# Altium schematic symbol library IC_ADI.SCHLIB: 3169 symbols (part 94 of 181)
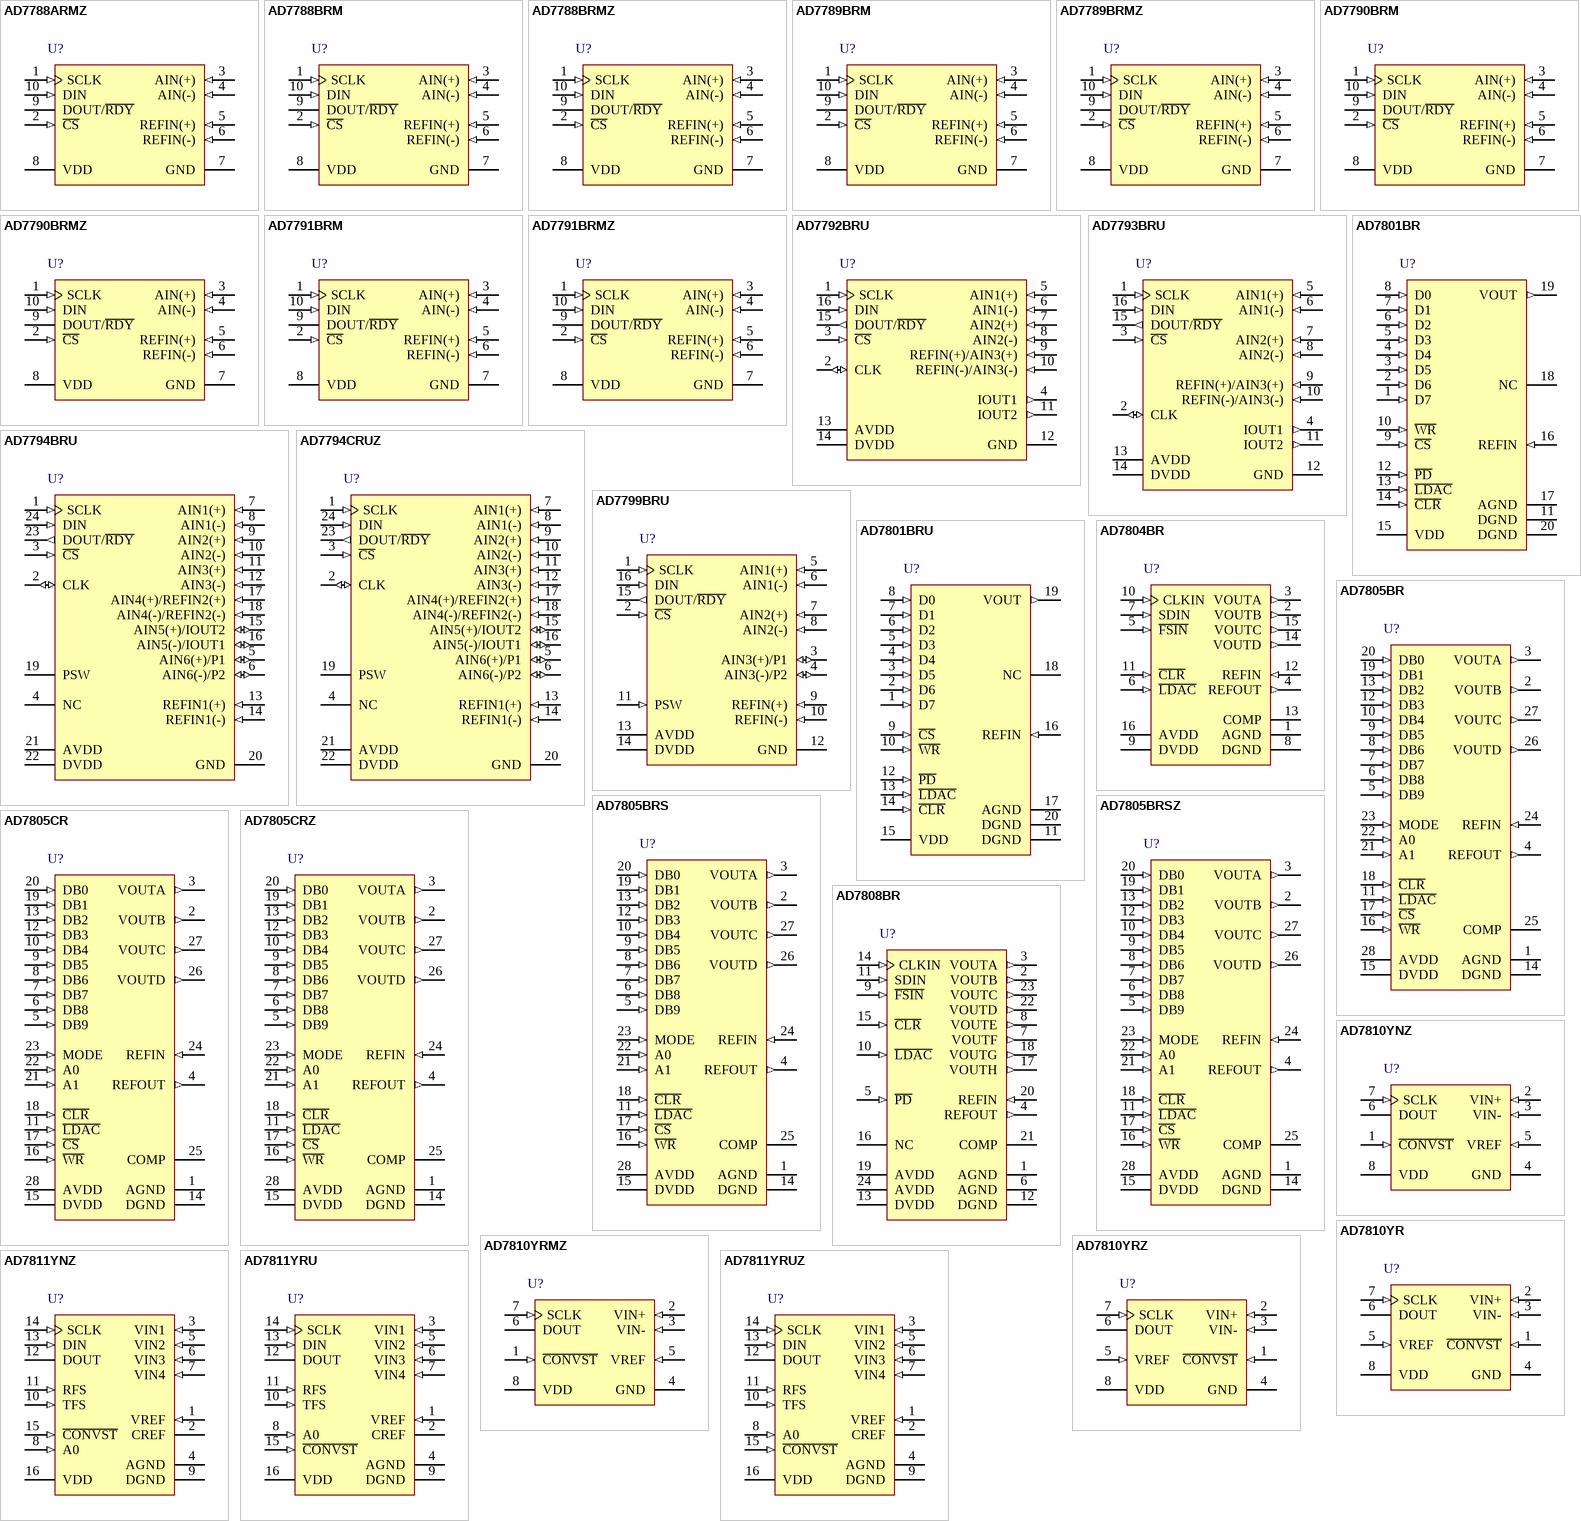
[diagram p284: symbols AD7788ARMZ to AD7811YRUZ]

## AD7789BRMZ
designator U?
Single 24-Bit Low Power Sigma-Delta Analog-to-Digital Converter with Serial, SPI Interface, 16.6SPS, -40 to +105 degC, RM-10, Pb-Free, Tube; Generic Part Number: AD7789; PartNumber: AD7789BRMZ; Resolution (Bits): 24; Channels: 1; Throughput Rate (SPS): 16.6; Interface: Ser, SPI; DatasheetVersion: Rev.B; PackageVersion: May-2005; PackageReference: RM-10; PackageDescription: 10-Lead Mini Small Outline Package [MSOP]; Supplier Part Number 1: AD7789BRMZ-ND; Supplier Part Number 2: 1143278; Supplier Part Number 3: 59K5451; Supplier Part Number 4: 584-AD7789BRMZ; RoHS: Y; Packing: Tube; Mounting Technology: Surface Mount; ComponentLink1Description: Manufacturer URL; ComponentLink2Description: Datasheet; ComponentLink3Description: Package Specification; ComponentLink4Description: Product URL
footprint VSSOP10_0.5 (Footprint not found)
pins: 1 SCLK (in) "Serial Clock Input for Data Transfers to and from the ADC. The SCLK has a Schmitt-triggered input, making the interface suitable for opto-isolated applications. The serial clock can be continuous, with all data transmitted (See Datasheet)", 2 ~{CS} (in) "Chip Select Input. This is an active low logic input used to select the ADC. C\S\ can be used to select the ADC in systems with more than one device on the serial bus or as a frame synchronization signal in communicating (See Datasheet)", 3 AIN(+) (in) "Analog Input. AIN(+) is the positive terminal of the fully differential analog input.", 4 AIN(-) (in) "Analog Input. AIN(-) is the negative terminal of the fully differential analog input.", 5 REFIN(+) (in) "Positive Reference Input. REFIN(+) can lie anywhere between VDD and GND + 0.1 V. The nominal reference voltage (REFIN(+) - REFIN(-)) is 2.5 V, but the part functions with a reference from 0.1 V to VDD.", 6 REFIN(-) (in) "Negative Reference Input. This reference input can lie anywhere between GND and VDD - 0.1 V.", 7 GND (power) "Ground Reference Point.", 8 VDD (power) "Supply Voltage. 3 V or 5 V nominal.", 9 DOUT/~{RDY} (hiz) "The DOUT/R\D\Y\ falling edge can be used as an interrupt to a processor, indicating that valid data is available. With an external serial clock, the data can be read using the DOUT/R\D\Y\ pin. With C\S\ low, the data/control (See Datasheet)", 10 DIN (in) "Serial Data Input to the Input Shift Register on the ADC. Data in this shift register is transferred to the control registers within the ADC; the register selection bits of the communications register identify the (See Datasheet)"

## AD7790BRM
designator U?
Single 16-Bit Low Power Sigma-Delta Analog-to-Digital Converter with Serial, SPI Interface, 120SPS, -40 to +105 degC, RM-10, Tube; Generic Part Number: AD7790; PartNumber: AD7790BRM; Resolution (Bits): 16; Channels: 1; Throughput Rate (SPS): 120; Interface: Ser, SPI; DatasheetVersion: Rev.0; PackageVersion: May-2005; PackageReference: RM-10; PackageDescription: 10-Lead Mini Small Outline Package [MSOP]; Supplier Part Number 1: AD7790BRM-ND; Supplier Part Number 2: 584-AD7790BRM; RoHS: N; Packing: Tube; Mounting Technology: Surface Mount; ComponentLink1Description: Manufacturer URL; ComponentLink2Description: Datasheet; ComponentLink3Description: Package Specification; ComponentLink4Description: Product URL
footprint VSSOP10_0.5 (Footprint not found)
pins: 1 SCLK (in) "Serial Clock Input for Data Transfers to and from the ADC. The SCLK has a Schmitttriggered input, making the interface suitable for opto-isolated applications. The serial clock can be continuous with all data transmitted in (See Datasheet)", 2 ~{CS} (in) "Chip Select Input. This is an active low logic input used to select the ADC. CS can be used to select the ADC in systems with more than one device on the serial bus or as a frame synchronization signal in communicating with (See Datasheet)", 3 AIN(+) (in) "Analog Input. AIN(+) is the positive terminal of the fully differential analog input.", 4 AIN(-) (in) "Analog Input. AIN(-) is the negative terminal of the fully differential analog input.", 5 REFIN(+) (in) "Positive Reference Input. REFIN(+) can lie anywhere between VDD and GND + 0.1 V. The nominal reference voltage (REFIN(+) --REFIN(-)) is 2.5 V, but the part functions with a reference from 0.1 V to VDD.", 6 REFIN(-) (in) "Negative Reference Input. This reference input can lie anywhere between GND and VDD - 0.1 V.", 7 GND (power) "Ground Reference Point.", 8 VDD (power) "Supply Voltage, 2.5 V to 5.25 V.", 9 DOUT/~{RDY} (hiz) "Serial Data Output/Data Ready Output. DOUT/R\D\Y\ serves a dual purpose . It functions as a serial data output pin to access the output shift register of the ADC. The output shift register can contain data from any of the (See Datasheet)", 10 DIN (in) "Serial Data Input to the Input Shift Register on the ADC. Data in this shift register is transferred to the control registers within the ADC, the register selection bits of the communications register identifying the (See Datasheet)"

## AD7790BRMZ
designator U?
Single 16-Bit Low Power Sigma-Delta Analog-to-Digital Converter with Serial, SPI Interface, 120SPS, -40 to +105 degC, RM-10, Pb-Free, Tube; Generic Part Number: AD7790; PartNumber: AD7790BRMZ; Resolution (Bits): 16; Channels: 1; Throughput Rate (SPS): 120; Interface: Ser, SPI; DatasheetVersion: Rev.0; PackageVersion: May-2005; PackageReference: RM-10; PackageDescription: 10-Lead Mini Small Outline Package [MSOP]; Supplier Part Number 1: AD7790BRMZ-ND; Supplier Part Number 2: 1438545; Supplier Part Number 3: 59K5456; Supplier Part Number 4: 584-AD7790BRMZ; RoHS: Y; Packing: Tube; Mounting Technology: Surface Mount; ComponentLink1Description: Manufacturer URL; ComponentLink2Description: Datasheet; ComponentLink3Description: Package Specification; ComponentLink4Description: Product URL
footprint VSSOP10_0.5 (Footprint not found)
pins: 1 SCLK (in) "Serial Clock Input for Data Transfers to and from the ADC. The SCLK has a Schmitttriggered input, making the interface suitable for opto-isolated applications. The serial clock can be continuous with all data transmitted in (See Datasheet)", 2 ~{CS} (in) "Chip Select Input. This is an active low logic input used to select the ADC. CS can be used to select the ADC in systems with more than one device on the serial bus or as a frame synchronization signal in communicating with (See Datasheet)", 3 AIN(+) (in) "Analog Input. AIN(+) is the positive terminal of the fully differential analog input.", 4 AIN(-) (in) "Analog Input. AIN(-) is the negative terminal of the fully differential analog input.", 5 REFIN(+) (in) "Positive Reference Input. REFIN(+) can lie anywhere between VDD and GND + 0.1 V. The nominal reference voltage (REFIN(+) --REFIN(-)) is 2.5 V, but the part functions with a reference from 0.1 V to VDD.", 6 REFIN(-) (in) "Negative Reference Input. This reference input can lie anywhere between GND and VDD - 0.1 V.", 7 GND (power) "Ground Reference Point.", 8 VDD (power) "Supply Voltage, 2.5 V to 5.25 V.", 9 DOUT/~{RDY} (hiz) "Serial Data Output/Data Ready Output. DOUT/R\D\Y\ serves a dual purpose . It functions as a serial data output pin to access the output shift register of the ADC. The output shift register can contain data from any of the (See Datasheet)", 10 DIN (in) "Serial Data Input to the Input Shift Register on the ADC. Data in this shift register is transferred to the control registers within the ADC, the register selection bits of the communications register identifying the (See Datasheet)"

## AD7791BRM
designator U?
Single 24-Bit Low Power Sigma-Delta Analog-to-Digital Converter with Serial, SPI Interface, 120SPS, -40 to +105 degC, RM-10, Tube; Generic Part Number: AD7791; PartNumber: AD7791BRM; Resolution (Bits): 24; Channels: 1; Throughput Rate (SPS): 120; Interface: Ser, SPI; DatasheetVersion: Rev.0; PackageVersion: May-2005; PackageReference: RM-10; PackageDescription: 10-Lead Mini Small Outline Package [MSOP]; Supplier Part Number 1: AD7791BRM-ND; Supplier Part Number 2: 584-AD7791BRM; RoHS: N; Packing: Tube; Mounting Technology: Surface Mount; ComponentLink1Description: Manufacturer URL; ComponentLink2Description: Datasheet; ComponentLink3Description: Package Specification; ComponentLink4Description: Product URL
footprint VSSOP10_0.5 (Footprint not found)
pins: 1 SCLK (in) "Serial Clock Input for Data Transfers to and from the ADC. The SCLK has a Schmitttriggered input, making the interface suitable for opto-isolated applications. The serial clock can be continuous with all data transmitted in (See Datasheet)", 2 ~{CS} (in) "Chip Select Input. This is an active low logic input used to select the ADC. C\S\ can be used to select the ADC in systems with more than one device on the serial bus or as a frame synchronization signal in communicating (See Datasheet)", 3 AIN(+) (in) "Analog Input. AIN(+) is the positive terminal of the fully differential analog input.", 4 AIN(-) (in) "Analog Input. AIN(-) is the negative terminal of the fully differential analog input.", 5 REFIN(+) (in) "Positive Reference Input. REFIN(+) can lie anywhere between VDD and GND + 0.1 V. The nominal reference voltage (REFIN(+) -REFIN(-)) is 2.5 V, but the part functions with a reference from 0.1 V to VDD.", 6 REFIN(-) (in) "Negative Reference Input. This reference input can lie anywhere between GND and VDD - 0.1 V.", 7 GND (power) "Ground Reference Point.", 8 VDD (power) "Supply Voltage, 2.5 V to 5.25 V.", 9 DOUT/~{RDY} (hiz) "Serial Data Output/Data Ready Output. DOUT/R\D\Y\ serves a dual purpose . It functions as a serial data output pin to access the output shift register of the ADC. The output shift register can contain data from any of the (See Datasheet)", 10 DIN (in) "Serial Data Input to the Input Shift Register on the ADC. Data in this shift register is transferred to the control registers within the ADC, the register selection bits of the communications register identifying the (See Datasheet)"

## AD7791BRMZ
designator U?
Single 24-Bit Low Power Sigma-Delta Analog-to-Digital Converter with Serial, SPI Interface, 120SPS, -40 to +105 degC, RM-10, Pb-Free, Tube; Generic Part Number: AD7791; PartNumber: AD7791BRMZ; Resolution (Bits): 24; Channels: 1; Throughput Rate (SPS): 120; Interface: Ser, SPI; DatasheetVersion: Rev.0; PackageVersion: May-2005; PackageReference: RM-10; PackageDescription: 10-Lead Mini Small Outline Package [MSOP]; Supplier Part Number 1: AD7791BRMZ-ND; Supplier Part Number 2: 1581942; Supplier Part Number 3: 19M0896; Supplier Part Number 4: 584-AD7791BRMZ; RoHS: Y; Packing: Tube; Mounting Technology: Surface Mount; ComponentLink1Description: Manufacturer URL; ComponentLink2Description: Datasheet; ComponentLink3Description: Package Specification; ComponentLink4Description: Product URL
footprint VSSOP10_0.5 (Footprint not found)
pins: 1 SCLK (in) "Serial Clock Input for Data Transfers to and from the ADC. The SCLK has a Schmitttriggered input, making the interface suitable for opto-isolated applications. The serial clock can be continuous with all data transmitted in (See Datasheet)", 2 ~{CS} (in) "Chip Select Input. This is an active low logic input used to select the ADC. C\S\ can be used to select the ADC in systems with more than one device on the serial bus or as a frame synchronization signal in communicating (See Datasheet)", 3 AIN(+) (in) "Analog Input. AIN(+) is the positive terminal of the fully differential analog input.", 4 AIN(-) (in) "Analog Input. AIN(-) is the negative terminal of the fully differential analog input.", 5 REFIN(+) (in) "Positive Reference Input. REFIN(+) can lie anywhere between VDD and GND + 0.1 V. The nominal reference voltage (REFIN(+) -REFIN(-)) is 2.5 V, but the part functions with a reference from 0.1 V to VDD.", 6 REFIN(-) (in) "Negative Reference Input. This reference input can lie anywhere between GND and VDD - 0.1 V.", 7 GND (power) "Ground Reference Point.", 8 VDD (power) "Supply Voltage, 2.5 V to 5.25 V.", 9 DOUT/~{RDY} (hiz) "Serial Data Output/Data Ready Output. DOUT/R\D\Y\ serves a dual purpose . It functions as a serial data output pin to access the output shift register of the ADC. The output shift register can contain data from any of the (See Datasheet)", 10 DIN (in) "Serial Data Input to the Input Shift Register on the ADC. Data in this shift register is transferred to the control registers within the ADC, the register selection bits of the communications register identifying the (See Datasheet)"

## AD7792BRU
designator U?
3 Channel 16-Bit Low Noise Low Power Sigma-Delta Analog-to-Digital Converter with Serial, SPI Interface and On-Chip In-Amp and Reference, 4.17 / 470SPS, -40 to +105 degC, RU-16, Tube; Generic Part Number: AD7792; PartNumber: AD7792BRU; Resolution (Bits): 16; Channels: 3; Throughput Rate (SPS): 470; Interface: Ser, SPI; DatasheetVersion: Rev.B; PackageVersion: Nov-2002; PackageReference: RU-16; PackageDescription: 16-Lead Thin Shrink Small Outline Package [TSSOP]; Supplier Part Number 1: AD7792BRU-ND; Supplier Part Number 2: 584-AD7792BRU; RoHS: N; Packing: Tube; Mounting Technology: Surface Mount; Code_JEDEC: MO-153-AB; ComponentLink1Description: Manufacturer URL; ComponentLink2Description: Datasheet; ComponentLink3Description: Package Specification; ComponentLink4Description: Product URL
footprint TSSOP16_0.65 (Footprint not found)
pins: 1 SCLK (in) "Serial Clock Input. This serial clock input is for data transfers to and from the ADC. The SCLK has a Schmitt-triggered input, making the interface suitable for opto-isolated applications. The serial clock can be continuous (See Datasheet)", 2 CLK (io) "Clock In/Clock Out. The internal clock can be made available at this pin. Alternatively, the internal clock can be disabled, and the ADC can be driven by an external clock. This allows several ADCs to be driven from a common (See Datasheet)", 3 ~{CS} (in) "Chip Select Input. This is an active low logic input used to select the ADC. C\S\ can be used to select the ADC in systems with more than one device on the serial bus or as a frame synchronization signal in communicating (See Datasheet)", 4 IOUT1 (out) "Output of Internal Excitation Current Source. The internal excitation current source can be made available at this pin. The excitation current source is programmable so that the current can be 10 uA, 210 uA, or 1 mA. Either (See Datasheet)", 5 AIN1(+) (in) "Analog Input. AIN1(+) is the positive terminal of the differential analog input pair AIN1(+)/AIN1(?).", 6 AIN1(-) (in) "Analog Input. AIN1(?) is the negative terminal of the differential analog input pair AIN1(+)/AIN1(?).", 7 AIN2(+) (in) "Analog Input. AIN2(+) is the positive terminal of the differential analog input pair AIN2(+)/AIN2(?).", 8 AIN2(-) (in) "Analog Input. AIN2(?) is the negative terminal of the differential analog input pair AIN2(+)/AIN2(?).", 9 REFIN(+)/AIN3(+) (in) "Positive Reference Input/Analog Input. An external reference can be applied between REFIN(+) and REFIN(?). REFIN(+) can lie anywhere between AVDD and GND + 0.1 V. The nominal reference voltage REFIN(+) ? REFIN(?) is 2.5 V, (See Datasheet)", 10 REFIN(-)/AIN3(-) (in) "Negative Reference Input/Analog Input. REFIN(?) is the negative reference input for REFIN. This reference input can lie anywhere between GND and AVDD ? 0.1 V. This pin also functions as AIN3(?), which is the negative (See Datasheet)", 11 IOUT2 (out) "Output of Internal Excitation Current Source. The internal excitation current source can be made available at this pin. The excitation current source is programmable so that the current can be 10 uA, 210 uA, or 1 mA. Either (See Datasheet)", 12 GND (power) "Ground Reference Point.", 13 AVDD (power) "Supply Voltage, 2.7 V to 5.25 V.", 14 DVDD (power) "Digital Interface Supply Voltage. The logic levels for the serial interface pins are related to this supply, which is between 2.7 V and 5.25 V. The DVDD voltage is independent of the voltage on AVDD; therefore, AVDD can (See Datasheet)", 15 DOUT/~{RDY} (out) "Serial Data Output/Data Ready Output. DOUT/RDY serves a dual purpose. It functions as a serial data output pin to access the output shift register of the ADC. The output shift register can contain data from any of the (See Datasheet)", 16 DIN (in) "Serial Data Input. This serial data input is to the input shift register on the ADC. Data in this shift register is transferred to the control registers within the ADC; the register selection bits of the communications (See Datasheet)"

## AD7793BRU
designator U?
3 Channel 24-Bit Low Noise Low Power Sigma-Delta Analog-to-Digital Converter with Serial, SPI Interface and On-Chip In-Amp and Reference, 4.17 / 470SPS, -40 to +105 degC, RU-16, Tube; Generic Part Number: AD7793; PartNumber: AD7793BRU; Resolution (Bits): 24; Channels: 3; Throughput Rate (SPS): 470; Interface: Ser, SPI; DatasheetVersion: Rev.B; PackageVersion: Nov-2002; PackageReference: RU-16; PackageDescription: 16-Lead Thin Shrink Small Outline Package [TSSOP]; Supplier Part Number 1: AD7793BRU-ND; Supplier Part Number 2: 584-AD7793BRU; RoHS: N; Packing: Tube; Mounting Technology: Surface Mount; Code_JEDEC: MO-153-AB; ComponentLink1Description: Manufacturer URL; ComponentLink2Description: Datasheet; ComponentLink3Description: Package Specification; ComponentLink4Description: Product URL
footprint TSSOP16_0.65 (Footprint not found)
pins: 1 SCLK (in) "Serial Clock Input. This serial clock input is for data transfers to and from the ADC. The SCLK has a Schmitttriggered input, making the interface suitable for opto-isolated applications. The serial clock can be continuous (See Datasheet)", 2 CLK (io) "Clock In/Clock Out. The internal clock can be made available at this pin. Alternatively, the internal clock can be disabled, and the ADC can be driven by an external clock. This allows several ADCs to be driven from a common (See Datasheet)", 3 ~{CS} (in) "Chip Select Input. This is an active low logic input used to select the ADC. C\S\ can be used to select the ADC in systems with more than one device on the serial bus or as a frame synchronization signal in communicating (See Datasheet)", 4 IOUT1 (out) "Output of Internal Excitation Current Source. The internal excitation current source can be made available at this pin. The excitation current source is programmable so that the current can be 10 uA, 210 uA, or 1 mA. Either (See Datasheet)", 5 AIN1(+) (in) "Analog Input. AIN1(+) is the positive terminal of the differential analog input pair AIN1(+)/AIN1(-).", 6 AIN1(-) (in) "Analog Input. AIN1(-) is the negative terminal of the differential analog input pair AIN1(+)/AIN1(-).", 7 AIN2(+) (in) "Analog Input. AIN2(+) is the positive terminal of the differential analog input pair AIN2(+)/AIN2(-).", 8 AIN2(-) (in) "Analog Input. AIN2(-) is the negative terminal of the differential analog input pair AIN2(+)/AIN2(-).", 9 REFIN(+)/AIN3(+) (in) "Positive Reference Input/Analog Input. An external reference can be applied between REFIN(+) and REFIN(-). REFIN(+) can lie anywhere between AVDD and GND + 0.1 V. The nominal reference voltage  REFIN(+) - REFIN(-) is 2.5 V, (See Datasheet)", 10 REFIN(-)/AIN3(-) (in) "Negative Reference Input/Analog Input. REFIN(-) is the negative reference input for REFIN. This reference input can lie anywhere between GND and AVDD - 0.1 V. This pin also functions as AIN3(-), which is the negative (See Datasheet)", 11 IOUT2 (out) "Output of Internal Excitation Current Source. The internal excitation current source can be made available at this pin. The excitation current source is programmable so that the current can be 10 uA, 210 uA, or 1 mA. Either (See Datasheet)", 12 GND "Ground Reference Point.", 13 AVDD (power) "Supply Voltage, 2.7 V to 5.25 V.", 14 DVDD (power) "Digital Interface Supply Voltage. The logic levels for the serial interface pins are related to this supply, which is between 2.7 V and 5.25 V. The DVDD voltage is independent of the voltage on AVDD; therefore, AVDD can (See Datasheet)", 15 DOUT/~{RDY} (out) "Serial Data Output/Data Ready Output. DOUT/R\D\Y\ serves a dual purpose. It functions as a serial data output pin to access the output shift register of the ADC. The output shift register can contain data from any of the (See Datasheet)", 16 DIN (in) "Serial Data Input. This serial data input is to the input shift register on the ADC. Data in this shift register is transferred to the control registers within the ADC; the register selection bits of the communications (See Datasheet)"

## AD7794BRU
designator U?
6 Channel 24-Bit Low Noise Low Power Sigma-Delta Analog-to-Digital Converter with Serial, SPI Interface and On-Chip In-Amp and Reference, 4.17 / 470SPS, -40 to +105 degC, RU-24, Tube; Generic Part Number: AD7794; PartNumber: AD7794BRU; Resolution (Bits): 24; Channels: 6; Throughput Rate (SPS): 470; Interface: Ser, SPI; DatasheetVersion: Rev.D; PackageVersion: 2002; PackageReference: RU-24; PackageDescription: 24-Lead Thin Shrink Small Outline Package [TSSOP]; Supplier Part Number 1: AD7794BRU-ND; Supplier Part Number 2: 584-AD7794BRU; RoHS: N; Packing: Tube; Mounting Technology: Surface Mount; Code_JEDEC: MO-153-AD; ComponentLink1Description: Manufacturer URL; ComponentLink2Description: Datasheet; ComponentLink3Description: Package Specification; ComponentLink4Description: Product URL
footprint TSSOP24_0.65 (Footprint not found)
pins: 1 SCLK (in) "Serial Clock Input. This serial clock input is for data transfers to and from the ADC. The SCLK has a Schmitttriggered input, making the interface suitable for opto-isolated applications. The serial clock can be continuous (See Datasheet)", 2 CLK (io) "Clock In/Clock Out. The internal clock can be made available at this pin. Alternatively, the internal clock can be disabled, and the ADC can be driven by an external clock. This allows several ADCs to be driven from a common (See Datasheet)", 3 ~{CS} (in) "Chip Select Input. This is an active low logic input used to select the ADC. C\S\ can be used to select the ADC in systems with more than one device on the serial bus or as a frame synchronization signal in communicating (See Datasheet)", 4 NC "No Connect.", 5 AIN6(+)/P1 (io) "Analog Input/Digital Output Pin. AIN6(+) is the positive terminal of the differential analog input pair,AIN6(+)/AIN6(-). This pin can also function as a general-purpose output bit referenced between AVDD and GND.", 6 AIN6(-)/P2 (io) "Analog Input/Digital Output Pin. AIN6(-) is the negative terminal of the differential analog input pair,AIN6(+)/AIN6(-). This pin can also function as a general-purpose output bit referenced between AVDD and GND.", 7 AIN1(+) (in) "Analog Input. AIN1(+) is the positive terminal of the differential analog input pair, AIN1(+)/AIN1(-).", 8 AIN1(-) (in) "Analog Input. AIN1(-) is the negative terminal of the differential analog input pair, AIN1(+)/AIN1(-).", 9 AIN2(+) (in) "Analog Input. AIN2(+) is the positive terminal of the differential analog input pair, AIN2(+)/AIN2(-).", 10 AIN2(-) (in) "Analog Input. AIN2(-) is the negative terminal of the differential analog input pair, AIN2(+)/AIN2(-).", 11 AIN3(+) (in) "Analog Input. AIN3(+) is the positive terminal of the differential analog input pair, AIN3(+)/AIN3(-).", 12 AIN3(-) (in) "Analog Input. AIN3(-) is the negative terminal of the differential analog input pair, AIN3(+)/AIN3(-).", 13 REFIN1(+) (in) "Positive Reference Input. An external reference can be applied between REFIN1(+) and REFIN1(-). REFIN1(+) can lie anywhere between AVDD and GND + 0.1 V. The nominal reference voltage, (REFIN1(+) - REFIN1(-)), is 2.5 V, but (See Datasheet)", 14 REFIN1(-) (in) "Negative Reference Input. This reference input can lie anywhere between GND and AVDD - 0.1 V.", 15 AIN5(+)/IOUT2 (io) "Analog Input/Output of Internal Excitation Current Source. AIN5(+) is the positive terminal of the differential analog input pair AIN5(+)/AIN5(-). Alternatively, the internal excitation current source can be made available (See Datasheet)", 16 AIN5(-)/IOUT1 (io) "Analog Input/Output of Internal Excitation Current Source. AIN5(-) is the negative terminal of the differential analog input pair, AIN5(+)/AIN5(-). Alternatively, the internal excitation current source can be made available (See Datasheet)", 17 AIN4(+)/REFIN2(+) (in) "Analog Input/Positive Reference Input. AIN4(+) is the positive terminal of the differential analog input pair AIN4(+)/AIN4(-). This pin also functions as a positive reference input for REFIN2. REFIN2(+) can lie anywhere (See Datasheet)", 18 AIN4(-)/REFIN2(-) (in) "Analog Input/Negative Reference Input. AIN4(-) is the negative terminal of the differential analog input pair AIN4(+)/AIN4(-). This pin also functions as the negative reference input for REFIN2. This reference input can lie (See Datasheet)", 19 PSW "Low-Side Power Switch to GND.", 20 GND (power) "Ground Reference Point.", 21 AVDD (power) "Supply Voltage, 2.7 V to 5.25 V.", 22 DVDD (power) "Serial Interface Supply Voltage, 2.7 V to 5.25 V. DVDD is independent of AVDD. Therefore, the serial interface operates at 3 V with AVDD at 5 V or vice versa.", 23 DOUT/~{RDY} (out) "Serial Data Output/Data Ready Output. DOUT/R\D\Y\ serves a dual purpose. It functions as a serial data output pin to access the output shift register of the ADC. The output shift register can contain data from any of the (See Datasheet)", 24 DIN (in) "Serial Data Input to the Input Shift Register on the ADC. Data in this shift register is transferred to the control registers within the ADC with the register selection bits of the communications register identifying the (See Datasheet)"

## AD7794CRUZ
designator U?
6 Channel 24-Bit Low Noise Low Power Sigma-Delta Analog-to-Digital Converter with Serial, SPI Interface and On-Chip In-Amp and Reference, 4.17 / 470SPS, -40 to +125 degC, RU-24, Pb-Free, Tube; Generic Part Number: AD7794; PartNumber: AD7794CRUZ; Resolution (Bits): 24; Channels: 6; Throughput Rate (SPS): 470; Interface: Ser, SPI; DatasheetVersion: Rev.D; PackageVersion: 2002; PackageReference: RU-24; PackageDescription: 24-Lead Thin Shrink Small Outline Package [TSSOP]; Supplier Part Number 1: AD7794CRUZ-ND; Supplier Part Number 2: 2192216; Supplier Part Number 3: 28M4062; Supplier Part Number 4: 584-AD7794CRUZ; RoHS: Y; Packing: Tube; Mounting Technology: Surface Mount; Code_JEDEC: MO-153-AD; ComponentLink1Description: Manufacturer URL; ComponentLink2Description: Datasheet; ComponentLink3Description: Package Specification; ComponentLink4Description: Product URL
footprint TSSOP24_0.65 (Footprint not found)
pins: 1 SCLK (in) "Serial Clock Input. This serial clock input is for data transfers to and from the ADC. The SCLK has a Schmitttriggered input, making the interface suitable for opto-isolated applications. The serial clock can be continuous (See Datasheet)", 2 CLK (io) "Clock In/Clock Out. The internal clock can be made available at this pin. Alternatively, the internal clock can be disabled, and the ADC can be driven by an external clock. This allows several ADCs to be driven from a common (See Datasheet)", 3 ~{CS} (in) "Chip Select Input. This is an active low logic input used to select the ADC. C\S\ can be used to select the ADC in systems with more than one device on the serial bus or as a frame synchronization signal in communicating (See Datasheet)", 4 NC "No Connect.", 5 AIN6(+)/P1 (io) "Analog Input/Digital Output Pin. AIN6(+) is the positive terminal of the differential analog input pair,AIN6(+)/AIN6(-). This pin can also function as a general-purpose output bit referenced between AVDD and GND.", 6 AIN6(-)/P2 (io) "Analog Input/Digital Output Pin. AIN6(-) is the negative terminal of the differential analog input pair,AIN6(+)/AIN6(-). This pin can also function as a general-purpose output bit referenced between AVDD and GND.", 7 AIN1(+) (in) "Analog Input. AIN1(+) is the positive terminal of the differential analog input pair, AIN1(+)/AIN1(-).", 8 AIN1(-) (in) "Analog Input. AIN1(-) is the negative terminal of the differential analog input pair, AIN1(+)/AIN1(-).", 9 AIN2(+) (in) "Analog Input. AIN2(+) is the positive terminal of the differential analog input pair, AIN2(+)/AIN2(-).", 10 AIN2(-) (in) "Analog Input. AIN2(-) is the negative terminal of the differential analog input pair, AIN2(+)/AIN2(-).", 11 AIN3(+) (in) "Analog Input. AIN3(+) is the positive terminal of the differential analog input pair, AIN3(+)/AIN3(-).", 12 AIN3(-) (in) "Analog Input. AIN3(-) is the negative terminal of the differential analog input pair, AIN3(+)/AIN3(-).", 13 REFIN1(+) (in) "Positive Reference Input. An external reference can be applied between REFIN1(+) and REFIN1(-). REFIN1(+) can lie anywhere between AVDD and GND + 0.1 V. The nominal reference voltage, (REFIN1(+) - REFIN1(-)), is 2.5 V, but (See Datasheet)", 14 REFIN1(-) (in) "Negative Reference Input. This reference input can lie anywhere between GND and AVDD - 0.1 V.", 15 AIN5(+)/IOUT2 (io) "Analog Input/Output of Internal Excitation Current Source. AIN5(+) is the positive terminal of the differential analog input pair AIN5(+)/AIN5(-). Alternatively, the internal excitation current source can be made available (See Datasheet)", 16 AIN5(-)/IOUT1 (io) "Analog Input/Output of Internal Excitation Current Source. AIN5(-) is the negative terminal of the differential analog input pair, AIN5(+)/AIN5(-). Alternatively, the internal excitation current source can be made available (See Datasheet)", 17 AIN4(+)/REFIN2(+) (in) "Analog Input/Positive Reference Input. AIN4(+) is the positive terminal of the differential analog input pair AIN4(+)/AIN4(-). This pin also functions as a positive reference input for REFIN2. REFIN2(+) can lie anywhere (See Datasheet)", 18 AIN4(-)/REFIN2(-) (in) "Analog Input/Negative Reference Input. AIN4(-) is the negative terminal of the differential analog input pair AIN4(+)/AIN4(-). This pin also functions as the negative reference input for REFIN2. This reference input can lie (See Datasheet)", 19 PSW "Low-Side Power Switch to GND.", 20 GND (power) "Ground Reference Point.", 21 AVDD (power) "Supply Voltage, 2.7 V to 5.25 V.", 22 DVDD (power) "Serial Interface Supply Voltage, 2.7 V to 5.25 V. DVDD is independent of AVDD. Therefore, the serial interface operates at 3 V with AVDD at 5 V or vice versa.", 23 DOUT/~{RDY} (out) "Serial Data Output/Data Ready Output. DOUT/R\D\Y\ serves a dual purpose. It functions as a serial data output pin to access the output shift register of the ADC. The output shift register can contain data from any of the (See Datasheet)", 24 DIN (in) "Serial Data Input to the Input Shift Register on the ADC. Data in this shift register is transferred to the control registers within the ADC with the register selection bits of the communications register identifying the (See Datasheet)"

## AD7799BRU
designator U?
3 Channel 24-Bit Low Noise Low Power Sigma-Delta Analog-to-Digital Converter with Serial, SPI Interface and On-Chip In-Amp, 470SPS, -40 to +105 degC, RU-16, Tube; Generic Part Number: AD7799; PartNumber: AD7799BRU; Resolution (Bits): 24; Channels: 3; Throughput Rate (SPS): 470; Interface: Ser, SPI; DatasheetVersion: Rev.A; PackageVersion: Nov-2002; PackageReference: RU-16; PackageDescription: 16-Lead Thin Shrink Small Outline Package [TSSOP]; Supplier Part Number 1: AD7799BRU-ND; Supplier Part Number 2: 584-AD7799BRU; RoHS: N; Packing: Tube; Mounting Technology: Surface Mount; Code_JEDEC: MO-153-AB; ComponentLink1Description: Manufacturer URL; ComponentLink2Description: Datasheet; ComponentLink3Description: Package Specification; ComponentLink4Description: Product URL
footprint TSSOP16_0.65 (Footprint not found)
pins: 1 SCLK (in) "Serial Clock Input.  This serial clock input is for data transfers to and from the ADC. The SCLK has a Schmitt-triggered  input, making the interface suitable for opto-isolated applications. The serial clock can be (See Datasheet)", 2 ~{CS} (in) "Chip Select Input. This is an active low logic input used to select the ADC. C\S\ can be used to select the ADC in systems with more than one device on the serial bus, or it can be used as a frame synchronization signal when (See Datasheet)", 3 AIN3(+)/P1 (io) "Analog Input/Digital Output Pin. AIN3(+) is the positive terminal of the differential analog input pair AIN3(+)/AIN3(-).  Alternatively, this pin can function as a general-purpose output bit referenced between AVDD and GND", 4 AIN3(-)/P2 (io) "Analog Input/Digital Output Pin. AIN3(-) is the negative terminal of the differential analog input pair AIN3(+)/AIN3(-). Alternatively, this pin can function as a general-purpose output bit referenced between AVDD and GND", 5 AIN1(+) (in) "Analog Input. AIN1(+) is the positive terminal of the differential analog input pair AIN1(+)/AIN1(-).", 6 AIN1(-) (in) "Analog Input. AIN1(-) is the negative terminal of the differential analog input pair AIN1(+)/AIN1(-).", 7 AIN2(+) (in) "Analog Input. AIN2(+) is the positive terminal of the differential analog input pair AIN2(+)/AIN2(-).", 8 AIN2(-) (in) "Analog Input. AIN2(-) is the negative terminal of the differential analog input pair AIN2(+)/AIN2(-).", 9 REFIN(+) (in) "Positive Reference Input. An external reference can be applied between REFIN(+) and REFIN(-). REFIN(+) can lie  anywhere between AVDD and GND + 0.1 V. The nominal reference voltage (REFIN(+) - REFIN(-)) is 2.5 V, but the (See Datasheet)", 10 REFIN(-) (in) "Negative Reference Input. REFIN(-) is the negative reference input for REFIN. This reference input can lie anywhere between GND and AVDD - 0.1 V.", 11 PSW (in) "Low-Side Power Switch to GND.", 12 GND (power) "Ground Reference Point.", 13 AVDD (power) "Supply Voltage. 2.7 V to 5.25 V.", 14 DVDD (power) "Digital Interface Supply Voltage. The logic levels for the serial interface pins are related to this supply, which is between 2.7 V and 5.25 V. The DVDD voltage is independent of the voltage on AVDD; therefore, AVDD can (See Datasheet)", 15 DOUT/~{RDY} (out) "Serial Data Output/Data Ready Output. DOUT/R\D\Y\ serves a dual purpose. It functions as a serial data output pin to access the output shift register of the ADC. The output shift register can contain data from any of the (See Datasheet)", 16 DIN (in) "Serial Data Input to the Input Shift Register on the ADC. Data in this shift register is transferred to the control registers within the ADC, with the register selection bits of the communication register identifying the (See Datasheet)"

## AD7801BR
designator U?
Single 8-Bit Voltage Output Digital-to-Analog Converter with Parallel Interface, 2.7 to 5.5 V, -40 to +105 degC, RW-20, Tube; Generic Part Number: AD7801; PartNumber: AD7801BR; # DAC Outputs: 1; Max V+: 5.5V; Op Pwr Diss: 12.9mW; Resolution (Bits): 8; Settling Time: 1.2祍; Single Supply: Yes; DatasheetVersion: Rev.0; PackageVersion: 060706-A; PackageReference: RW-20; PackageDescription: 20-Lead Standard Small Outline Package [SOIC_W] Wide Body; Supplier Part Number 1: AD7801BR-ND; Supplier Part Number 2: 584-AD7801BR; Packing: Tube; RoHS: N; Mounting Technology: Surface Mount; Code_JEDEC: MS-013-AC; ComponentLink1Description: Manufacturer URL; ComponentLink2Description: Datasheet; ComponentLink3Description: Package Specification; ComponentLink4Description: Product URL
footprint SOIC20W_1.27 (Footprint not found)
pins: 1 D7 (in) "Parallel Data Inputs. 8-bit data is loaded to the input register of the AD7801 under the control of C\S\ and W\R\.", 2 D6 (in) "Parallel Data Inputs. 8-bit data is loaded to the input register of the AD7801 under the control of C\S\ and W\R\.", 3 D5 (in) "Parallel Data Inputs. 8-bit data is loaded to the input register of the AD7801 under the control of C\S\ and W\R\.", 4 D4 (in) "Parallel Data Inputs. 8-bit data is loaded to the input register of the AD7801 under the control of C\S\ and W\R\.", 5 D3 (in) "Parallel Data Inputs. 8-bit data is loaded to the input register of the AD7801 under the control of C\S\ and W\R\.", 6 D2 (in) "Parallel Data Inputs. 8-bit data is loaded to the input register of the AD7801 under the control of C\S\ and W\R\.", 7 D1 (in) "Parallel Data Inputs. 8-bit data is loaded to the input register of the AD7801 under the control of C\S\ and W\R\.", 8 D0 (in) "Parallel Data Inputs. 8-bit data is loaded to the input register of the AD7801 under the control of C\S\ and W\R\.", 9 ~{CS} (in) "Chip Select. Active low logic input.", 10 ~{WR} (in) "Write Input. W\R\ is an active low logic input used in conjunction with C\S\ to write data to the input register.", 11 DGND (power) "Digital Ground", 12 ~{PD} (in) "Active low input used to put the part into low power mode reducing current consumption to less than 1 礎.", 13 ~{LDAC} (in) "Load DAC Logic Input. When this logic input is taken low the DAC output is updated with the contents of its DAC register. If L\D\A\C\ is permanently tied low the DAC is updated on the rising edge of W\R\.", 14 ~{CLR} (in) "Asynchronous Clear Input (Active Low). When this input is taken low the DAC register is loaded with all zeroes and the DAC output is cleared to zero volts.", 15 VDD (power) "Power Supply Input. This part can be operated from +2.7 V to +5.5 V and should be decoupled to GND.", 16 REFIN (in) "External Reference Input. This can be used as the reference for the DAC. The range on this reference input is 1 V to VDD/2. If REFIN is tied directly to VDD the internal VDD/2 reference is selected.", 17 AGND (power) "Analog Ground reference point and return point for all analog current on the part.", 18 NC "No Connect Pin.", 19 VOUT (out) "Analog Output Voltage from the DAC. The output amplifier can swing rail to rail on its output.", 20 DGND (power) "Digital Ground reference point and return point for all digital current on the part."

## AD7801BRU
designator U?
Single 8-Bit Voltage Output Digital-to-Analog Converter with Parallel Interface, 2.7 to 5.5 V, -40 to +105 degC, RU-20, Tube; Generic Part Number: AD7801; PartNumber: AD7801BRU; # DAC Outputs: 1; Max V+: 5.5V; Op Pwr Diss: 12.9mW; Resolution (Bits): 8; Settling Time: 1.2祍; Single Supply: Yes; DatasheetVersion: Rev.0; PackageVersion: 2000; PackageReference: RU-20; PackageDescription: 20-Lead Thin Shrink Small Outline Package [TSSOP]; Supplier Part Number 1: AD7801BRU-ND; Supplier Part Number 2: 584-AD7801BRU; Packing: Tube; RoHS: N; Mounting Technology: Surface Mount; Code_JEDEC: MO-153AC; ComponentLink1Description: Manufacturer URL; ComponentLink2Description: Datasheet; ComponentLink3Description: Package Specification; ComponentLink4Description: Product URL
footprint TSSOP20_0.65 (Footprint not found)
pins: 1 D7 (in) "Parallel Data Inputs. 8-bit data is loaded to the input register of the AD7801 under the control of C\S\ and W\R\.", 2 D6 (in) "Parallel Data Inputs. 8-bit data is loaded to the input register of the AD7801 under the control of C\S\ and W\R\.", 3 D5 (in) "Parallel Data Inputs. 8-bit data is loaded to the input register of the AD7801 under the control of C\S\ and W\R\.", 4 D4 (in) "Parallel Data Inputs. 8-bit data is loaded to the input register of the AD7801 under the control of C\S\ and W\R\.", 5 D3 (in) "Parallel Data Inputs. 8-bit data is loaded to the input register of the AD7801 under the control of C\S\ and W\R\.", 6 D2 (in) "Parallel Data Inputs. 8-bit data is loaded to the input register of the AD7801 under the control of C\S\ and W\R\.", 7 D1 (in) "Parallel Data Inputs. 8-bit data is loaded to the input register of the AD7801 under the control of C\S\ and W\R\.", 8 D0 (in) "Parallel Data Inputs. 8-bit data is loaded to the input register of the AD7801 under the control of C\S\ and W\R\.", 9 ~{CS} (in) "Chip Select. Active low logic input.", 10 ~{WR} (in) "Write Input. W\R\ is an active low logic input used in conjunction with C\S\ to write data to the input register.", 11 DGND (power) "Digital Ground", 12 ~{PD} (in) "Active low input used to put the part into low power mode reducing current consumption to less than 1 uA.", 13 ~{LDAC} (in) "Load DAC Logic Input. When this logic input is taken low the DAC output is updated with the contents of its DAC register. If L\D\A\C\ is permanently tied low the DAC is updated on the rising edge of W\R\.", 14 ~{CLR} (in) "Asynchronous Clear Input (Active Low). When this input is taken low the DAC register is loaded with all zeroes and the DAC output is cleared to zero volts.", 15 VDD (power) "Power Supply Input. This part can be operated from +2.7 V to +5.5 V and should be decoupled to GND.", 16 REFIN (in) "External Reference Input. This can be used as the reference for the DAC. The range on this reference input is 1 V to VDD/2. If REFIN is tied directly to VDD the internal VDD/2 reference is selected.", 17 AGND (power) "Analog Ground reference point and return point for all analog current on the part.", 18 NC "No Connect Pin.", 19 VOUT (out) "Analog Output Voltage from the DAC. The output amplifier can swing rail to rail on its output.", 20 DGND (power) "Digital Ground reference point and return point for all digital current on the part."

## AD7804BR
designator U?
Quad 10-Bit Digital-to-Analog Converter, 3.3 to 5 V, -40 to +85 degC, RW-16, Tube; Generic Part Number: AD7804; PartNumber: AD7804BR; # DAC Outputs: 4; Max V+: 5.5V; Op Pwr Diss: 66mW; Resolution (Bits): 10; Settling Time: 1.5祍; Single Supply: Yes; DatasheetVersion: Rev.A; PackageVersion: 032707-B; PackageReference: RW-16; PackageDescription: 16-Lead Standard Small Outline Package [SOIC_W]; Supplier Part Number 1: AD7804BR-ND; Supplier Part Number 2: 584-AD7804BR; Packing: Tube; RoHS: N; Mounting Technology: Surface Mount; Code_JEDEC: MS-013-AA; Code_IPC: SOIC127P1030-16; ComponentLink1Description: Manufacturer URL; ComponentLink2Description: Datasheet; ComponentLink3Description: Package Specification; ComponentLink4Description: Product URL
footprint SOIC16W_1.27 (Footprint not found)
pins: 1 AGND (power) "Ground reference point for analog circuitry.", 2 VOUTB (out) "Analog output voltage from the DACs.", 3 VOUTA (out) "Analog output voltage from the DACs.", 4 REFOUT (out) "Reference Output. This is a bandgap reference and is typically 1.23 V.", 5 ~{FSIN} (in) "Level-triggered control input (active low). This is the frame synchronization signal for the input data. When F\S\I\N\ goes low, it enables the input shift register and data is transferred on the falling edges of CLKIN.", 6 ~{LDAC} (in) "L\D\A\C\ Input. When this digital input is taken low, all DAC registers are simultaneously updated with the contents of the data registers. If L\D\A\C\ is tied permanently low, or is low on the sixteenth falling clock edge (See Datasheet)", 7 SDIN (in) "Serial Data Input. These devices accept a 16-bit word. Data is clocked into the input shift register on the falling edge of CLKIN.", 8 DGND (power) "Ground reference point for digital circuitry.", 9 DVDD (power) "Digital Power Supply.", 10 CLKIN (in) "Clock Input. Data is clocked into the input shift register on the falling edges of CLKIN. Duty Cycle should be between 40% and 60%.", 11 ~{CLR} (in) "Asynchronous C\L\R\ Input. When this input is taken low, all Main DAC outputs are cleared either to VBIAS or to VBIAS/16 volts. All Sub DACs are also cleared and thus the transfer function of the Main DAC will remain (See Datasheet)", 12 REFIN (in) "This is an external reference input for the DACs. When this reference is selected for a DAC in the control register, the analog output from the selected DAC swings around this point.", 13 COMP "Compensation Pin. This pin provides an output from the internal VDD/2 divider and is provided for ac bypass purposes only. This pin should be decoupled with 1 nF capacitors to both AVDD and AGND. This pin can be overdriven (See Datasheet)", 14 VOUTD (out) "Analog output voltage from the DACs.", 15 VOUTC (out) "Analog output voltage from the DACs.", 16 AVDD (power) "Analog Power Supply. +3.3 V to +5 V."

## AD7805BR
designator U?
Quad 10-Bit Digital-to-Analog Converter, 3.3 to 5 V, 0 to +70 degC, RW-28, Tube; Generic Part Number: AD7805; PartNumber: AD7805BR; # DAC Outputs: 4; Max V+: 5.5V; Op Pwr Diss: 66mW; Resolution (Bits): 10; Settling Time: 1.5祍; Single Supply: Yes; DatasheetVersion: Rev.A; PackageVersion: 060706-A; PackageReference: RW-28; PackageDescription: 28-Lead Standard Small Outline Package [SOIC_W]; Supplier Part Number 1: AD7805BR-ND; Supplier Part Number 2: 584-AD7805BR; Packing: Tube; RoHS: N; Mounting Technology: Surface Mount; Code_JEDEC: MS-013-AE; ComponentLink1Description: Manufacturer URL; ComponentLink2Description: Datasheet; ComponentLink3Description: Product URL
footprint SOIC28W_1.27 (Footprint not found)
pins: 1 AGND (power) "Ground reference point for analog circuitry.", 2 VOUTB (out) "Analog output voltages from the DACs.", 3 VOUTA (out) "Analog output voltages from the DACs.", 4 REFOUT (out) "Reference Output. This is a bandgap reference and is typically 1.23 V.", 5 DB9 (in) "Data Input. DB9 is the 8 MSBs of the data word.", 6 DB8 (in) "Data Input. DB8 is the 8 MSBs of the data word.", 7 DB7 (in) "Data Input. DB7 is the 8 MSBs of the data word.", 8 DB6 (in) "Data Input. DB6 is the 8 MSBs of the data word.", 9 DB5 (in) "Data Input. DB5 is the 8 MSBs of the data word.", 10 DB4 (in) "Data Input. DB4 is the 8 MSBs of the data word.", 11 ~{LDAC} (in) "L\D\A\C\ Input. When this digital input is taken low, all DAC registers are simultaneously updated with the contents of the DAC data registers. If L\D\A\C\ is permanently tied low, or is low during the rising edge of W\R\ (See Datasheet)", 12 DB3 (in) "Data Input. DB3 is the 8 MSBs of the data word.", 13 DB2 (in) "Data Input. DB2 is the 8 MSBs of the data word.", 14 DGND (power) "Ground reference point for digital circuitry.", 15 DVDD (power) "Digital Power Supply.", 16 ~{WR} (in) "Write Input W\R\ is an active low logic input which is used in conjunction with C\S\ and the address pins to write data to the relevant registers.", 17 ~{CS} (in) "Chip Select. Active low logic input.", 18 ~{CLR} (in) "Asynchronous C\L\R\ Input.  When this input is taken low, all Main DAC outputs are cleared either to VBIAS or to VBIAS/16 volts. All Sub DACs are also cleared and thus the transfer function of the MAIN DAC will remain (See Datasheet)", 19 DB1 (in) "DB1 function as the 2 LSBs of the 10-bit word in 10-bit parallel mode but have other functions when BYTE loading structure is used.", 20 DB0 (in) "DB0 function as the 2 LSBs of the 10-bit word in 10-bit parallel mode but have other functions when BYTE loading structure is used.", 21 A1 (in) "DAC Address Inputs. These digital inputs are used in conjunction with C\S\ and W\R\ to determine which DAC channel control register or DAC data register is loaded from the input register. These address bits are don抰 cares (See Datasheet)", 22 A0 (in) "DAC Address Inputs. These digital inputs are used in conjunction with C\S\ and W\R\ to determine which DAC channel control register or DAC data register is loaded from the input register. These address bits are don抰 cares (See Datasheet)", 23 MODE (in) "Logic Input. Logic high enables writing to the DAC data registers, a logic low enables writing to the control registers.", 24 REFIN (in) "This is an external reference input for the DAC. When this reference is selected for the DAC in the control register, the analog output from the selected DAC swings around this point.", 25 COMP "Compensation Pin. This pin provides an output from the internal VDD/2 divider and is provided for ac bypass purposes only. This pin should be decoupled with 1 nF capacitors to both AVDD and AGND. This pin can be overdriven (See Datasheet)", 26 VOUTD (out) "Analog output voltages from the DACs.", 27 VOUTC (out) "Analog output voltages from the DACs.", 28 AVDD (power) "Analog Power Supply."

## AD7805BRS
designator U?
Quad 10-Bit Digital-to-Analog Converter, 3.3 to 5 V, -40 to +85 degC, RS-28, Tube; Generic Part Number: AD7805; PartNumber: AD7805BRS; # DAC Outputs: 4; Max V+: 5.5V; Op Pwr Diss: 66mW; Resolution (Bits): 10; Settling Time: 1.5祍; Single Supply: Yes; DatasheetVersion: Rev.A; PackageVersion: 060106-A; PackageReference: RS-28; PackageDescription: 28-Lead Shrink Small Outline Package [SSOP]; Supplier Part Number 1: AD7805BRS-ND; Supplier Part Number 2: 584-AD7805BRS; Packing: Tube; RoHS: N; Mounting Technology: Surface Mount; Code_JEDEC: MO-150-AH; ComponentLink1Description: Manufacturer URL; ComponentLink2Description: Datasheet; ComponentLink3Description: Package Specification; ComponentLink4Description: Product URL
footprint SSOP28_0.65 (Footprint not found)
pins: 1 AGND (power) "Ground reference point for analog circuitry.", 2 VOUTB (out) "Analog output voltages from the DACs.", 3 VOUTA (out) "Analog output voltages from the DACs.", 4 REFOUT (out) "Reference Output. This is a bandgap reference and is typically 1.23 V.", 5 DB9 (in) "Data Input. DB9 is the 8 MSBs of the data word.", 6 DB8 (in) "Data Input. DB8 is the 8 MSBs of the data word.", 7 DB7 (in) "Data Input. DB7 is the 8 MSBs of the data word.", 8 DB6 (in) "Data Input. DB6 is the 8 MSBs of the data word.", 9 DB5 (in) "Data Input. DB5 is the 8 MSBs of the data word.", 10 DB4 (in) "Data Input. DB4 is the 8 MSBs of the data word.", 11 ~{LDAC} (in) "L\D\A\C\ Input. When this digital input is taken low, all DAC registers are simultaneously updated with the contents of the DAC data registers. If L\D\A\C\ is permanently tied low, or is low during the rising edge of W\R\ (See Datasheet)", 12 DB3 (in) "Data Input. DB3 is the 8 MSBs of the data word.", 13 DB2 (in) "Data Input. DB2 is the 8 MSBs of the data word.", 14 DGND (power) "Ground reference point for digital circuitry.", 15 DVDD (power) "Digital Power Supply.", 16 ~{WR} (in) "Write Input W\R\ is an active low logic input which is used in conjunction with C\S\ and the address pins to write data to the relevant registers.", 17 ~{CS} (in) "Chip Select. Active low logic input.", 18 ~{CLR} (in) "Asynchronous C\L\R\ Input.  When this input is taken low, all Main DAC outputs are cleared either to VBIAS or to VBIAS/16 volts. All Sub DACs are also cleared and thus the transfer function of the MAIN DAC will remain (See Datasheet)", 19 DB1 (in) "DB1 function as the 2 LSBs of the 10-bit word in 10-bit parallel mode but have other functions when BYTE loading structure is used.", 20 DB0 (in) "DB0 function as the 2 LSBs of the 10-bit word in 10-bit parallel mode but have other functions when BYTE loading structure is used.", 21 A1 (in) "DAC Address Inputs. These digital inputs are used in conjunction with C\S\ and W\R\ to determine which DAC channel control register or DAC data register is loaded from the input register. These address bits are don抰 cares (See Datasheet)", 22 A0 (in) "DAC Address Inputs. These digital inputs are used in conjunction with C\S\ and W\R\ to determine which DAC channel control register or DAC data register is loaded from the input register. These address bits are don抰 cares (See Datasheet)", 23 MODE (in) "Logic Input. Logic high enables writing to the DAC data registers, a logic low enables writing to the control registers.", 24 REFIN (in) "This is an external reference input for the DAC. When this reference is selected for the DAC in the control register, the analog output from the selected DAC swings around this point.", 25 COMP "Compensation Pin. This pin provides an output from the internal VDD/2 divider and is provided for ac bypass purposes only. This pin should be decoupled with 1 nF capacitors to both AVDD and AGND. This pin can be overdriven (See Datasheet)", 26 VOUTD (out) "Analog output voltages from the DACs.", 27 VOUTC (out) "Analog output voltages from the DACs.", 28 AVDD (power) "Analog Power Supply."

## AD7805BRSZ
designator U?
Quad 10-Bit Digital-to-Analog Converter, 3.3 to 5 V, 0 to +70 degC, RS-28, Pb-Free, Tube; Generic Part Number: AD7805; PartNumber: AD7805BRSZ; # DAC Outputs: 4; Max V+: 5.5V; Op Pwr Diss: 66mW; Resolution (Bits): 10; Settling Time: 1.5祍; Single Supply: Yes; DatasheetVersion: Rev.A; PackageVersion: 060106-A; PackageReference: RS-28; PackageDescription: 28-Lead Shrink Small Outline Package [SSOP]; Supplier Part Number 1: AD7805BRSZ-ND; Supplier Part Number 2: 1438617; Supplier Part Number 3: 56P5005; Supplier Part Number 4: 59K5491; Supplier Part Number 5: 584-AD7805BRSZ; Packing: Tube; RoHS: Y; Mounting Technology: Surface Mount; Code_JEDEC: MO-150-AH; ComponentLink1Description: Manufacturer URL; ComponentLink2Description: Datasheet; ComponentLink3Description: Package Specification; ComponentLink4Description: Product URL
footprint SSOP28_0.65 (Footprint not found)
pins: 1 AGND (power) "Ground reference point for analog circuitry.", 2 VOUTB (out) "Analog output voltages from the DACs.", 3 VOUTA (out) "Analog output voltages from the DACs.", 4 REFOUT (out) "Reference Output. This is a bandgap reference and is typically 1.23 V.", 5 DB9 (in) "Data Input. DB9 is the 8 MSBs of the data word.", 6 DB8 (in) "Data Input. DB8 is the 8 MSBs of the data word.", 7 DB7 (in) "Data Input. DB7 is the 8 MSBs of the data word.", 8 DB6 (in) "Data Input. DB6 is the 8 MSBs of the data word.", 9 DB5 (in) "Data Input. DB5 is the 8 MSBs of the data word.", 10 DB4 (in) "Data Input. DB4 is the 8 MSBs of the data word.", 11 ~{LDAC} (in) "L\D\A\C\ Input. When this digital input is taken low, all DAC registers are simultaneously updated with the contents of the DAC data registers. If L\D\A\C\ is permanently tied low, or is low during the rising edge of W\R\ (See Datasheet)", 12 DB3 (in) "Data Input. DB3 is the 8 MSBs of the data word.", 13 DB2 (in) "Data Input. DB2 is the 8 MSBs of the data word.", 14 DGND (power) "Ground reference point for digital circuitry.", 15 DVDD (power) "Digital Power Supply.", 16 ~{WR} (in) "Write Input W\R\ is an active low logic input which is used in conjunction with C\S\ and the address pins to write data to the relevant registers.", 17 ~{CS} (in) "Chip Select. Active low logic input.", 18 ~{CLR} (in) "Asynchronous C\L\R\ Input.  When this input is taken low, all Main DAC outputs are cleared either to VBIAS or to VBIAS/16 volts. All Sub DACs are also cleared and thus the transfer function of the MAIN DAC will remain (See Datasheet)", 19 DB1 (in) "DB1 function as the 2 LSBs of the 10-bit word in 10-bit parallel mode but have other functions when BYTE loading structure is used.", 20 DB0 (in) "DB0 function as the 2 LSBs of the 10-bit word in 10-bit parallel mode but have other functions when BYTE loading structure is used.", 21 A1 (in) "DAC Address Inputs. These digital inputs are used in conjunction with C\S\ and W\R\ to determine which DAC channel control register or DAC data register is loaded from the input register. These address bits are don抰 cares (See Datasheet)", 22 A0 (in) "DAC Address Inputs. These digital inputs are used in conjunction with C\S\ and W\R\ to determine which DAC channel control register or DAC data register is loaded from the input register. These address bits are don抰 cares (See Datasheet)", 23 MODE (in) "Logic Input. Logic high enables writing to the DAC data registers, a logic low enables writing to the control registers.", 24 REFIN (in) "This is an external reference input for the DAC. When this reference is selected for the DAC in the control register, the analog output from the selected DAC swings around this point.", 25 COMP "Compensation Pin. This pin provides an output from the internal VDD/2 divider and is provided for ac bypass purposes only. This pin should be decoupled with 1 nF capacitors to both AVDD and AGND. This pin can be overdriven (See Datasheet)", 26 VOUTD (out) "Analog output voltages from the DACs.", 27 VOUTC (out) "Analog output voltages from the DACs.", 28 AVDD (power) "Analog Power Supply."